# Altium schematic symbol library IC.SchLib: 555 symbols (part 3 of 15) (continued)
## HYB18TC1G160BF-3S (continued)

## ICS524
designator U?
1 to 4 Single-Ended Clock Buffer Low Skew; Manufacturer: IDT; Manufacturer No: 524MILF; Comment2: 2.5/5.0V 200MHz; Sort: 510; Tech: SMDR; Package: SOIC; Price: 0
footprint SOIC8-1
pins: 1 ICLK, 2 Q0, 3 Q1, 4 NC, 5 VDD (power), 6 Q2, 7 Q3, 8 GND (oe)

## ICS551
designator U?
1 to 4 Single-Ended Clock Buffer; Manufacturer: IDT; Manufacturer No: 551MILF; Comment2: 3.3/5.0V 160MHz; Sort: 510; Tech: SMDR; Package: SOIC; Price: 0
footprint SOIC8-1
pins: 1 ICLK, 2 Q1, 3 Q2, 4 Q3, 5 Q4, 6 GND, 7 VDD, 8 OE

## ICS841S01
designator U?
PCI EXPRES CLOCK GENERATOR; Manufacturer: IDT; Manufacturer No: ICS841S01BGLFT; Sort: 510; Tech: SMDR; Package: TSSOP16; Price: 0
signal-integrity model Model Name (Model Description)
footprint TSSOP16 (TSSOP16 5x4.4mm R0.65mm)
pins: 1 VSS_SRC (power), 2 VDD_SRC (power), 3 SRCT0 (out), 4 SRCC0 (out), 5 VDD_SRC (power), 6 VSS_SRC (power), 7 IREF (in), 8 VSSA (power), 9 VDDA (power), 10 VSS_REF (power), 11 VDD_REF (power), 12 XTAL_IN (in), 13 XTAL_OUT (in), 14 SCLK (in), 15 SDATA (io), 16 VDD_SRC (power)

## ICS853S011BGILFT
designator U?
2.5V / 3.3V LVPECL/ECL 1:2  Differential Fanout Buffer; Manufacturer: IDT; Comment2: 2.5GHz, 130ps skew 2.5&3.3Vcc; Sort: 510; Tech: SMDR; Manufacturer No: ICS853S011BGILFT; Package: TSSOP8; Price: 0
footprint TSSOP8 (TSSOP8 3x3mm R0.65mm)
signal-integrity model Model Name (Model Description)
pins: 1 Q0 (out), 2 ~{Q0} (out), 3 Q1 (out), 4 ~{Q1} (out), 5 VEE (power), 6 ~{D} (in), 7 D (in), 8 VCC (power)

## ICS83026I-01
designator U?
Low skew, 1-to2, Differential to LVCMOS/LVTTL fanout buffer; Manufacturer: IDT; Manufacturer No: ICS83026BMI-01LF; Sort: 510; Tech: SMDR; Package: SOIC8; Price: 0
footprint SOIC8-1
signal-integrity model Model Name (Model Description)
pins: 1 Vdd (power), 2 CLK (in), 3 ~{CLK} (in), 4 OE (in), 5 GND (power), 6 Q1 (out), 7 Q0 (out), 8 Vddo (power)

## ICS87021AMILF
designator U?
/1 /2 Differential to LVCMOS/LVTTL clock generator; Manufacturer: IDT; Comment2: 2V5 - 3V3; Sort: 510; Tech: SMDR; Manufacturer No: ICS87021AMILF; Package: SOIC8; Price: 0
footprint SOIC8-1
signal-integrity model Model Name (Model Description)
pins: 1 CLK (in), 2 ~{CLK} (in), 3 MR (in), 4 F_SEL (in), 5 GND (power), 6 Q1 (out), 7 Q0 (out), 8 Vdd (power)

## ICS853111BYLF
designator U?
low skew, 1 to 10, differential to 2.5V, 3.3V LVPECL/ECL fanout buffer; Manufacturer: IDT; Sort: 510; Tech: SMDR; Manufacturer No: ICS853111BYLF; Package: TQFP32; Price: 0
footprint TQFP80P900X900X120_HS-32N (TQFP, 32-Leads, Body 9,0x9,0mm (max), Pitch 0,80mm, IPC Medium Density)
pins: 1 VCC (power), 2 CLK_SEL (in), 3 PCLK0 (in), 4 ~{PCLK0} (in), 5 VBB (out), 6 PCLK1 (in), 7 ~{PCLK1} (in), 8 VEE (power), 9 VCCO (power), 10 ~{Q9} (out), 11 Q9 (out), 12 ~{Q8} (out), 13 Q8 (out), 14 ~{Q7} (out), 15 Q7 (out), 16 VCCO (power), 17 ~{Q6} (out), 18 Q6 (out), 19 ~{Q5} (out), 20 Q5 (out), 21 ~{Q4} (out), 22 Q4 (out), 23 ~{Q3} (out), 24 Q3 (out), 25 VCCO (power), 26 ~{Q2} (out), 27 Q2 (out), 28 ~{Q1} (out), 29 Q1 (out), 30 ~{Q0} (out), 31 Q0 (out), 32 VCCO (power), 33 GNDEP (power)

## IDL-25LC040A-I/P
designator U?
EEPROM 4kbit SPI 2.5-5.5V PDIP8; Manufacturer: Microchip; Comment2: 64Kbit 2.5-5.5V 10MHz SPI; Sort: 510; Tech: SMDR; Manufacturer No: 25LC040A-I/P; Package: PDIP8; Price: 0; Supplier 1: Mouser; Supplier Part Number 1: 579-25LC040A-I/P; Supplier 2: Newark; Supplier Part Number 2: 35M0835; Supplier 3: Digi-Key; Supplier Part Number 3: 25LC040A-I/P-ND
signal-integrity model Model Name (Model Description)
footprint PDIL8 (DIP; 8 Leads; Row Spacing 7.62 mm; Pitch 2.54 mm)
pins: 1 ~{CS} (in), 2 SO (out), 3 ~{WP} (in), 4 VSS (power), 5 SI (in), 6 SCK (in), 7 ~{HOLD} (in), 8 VCC (power)

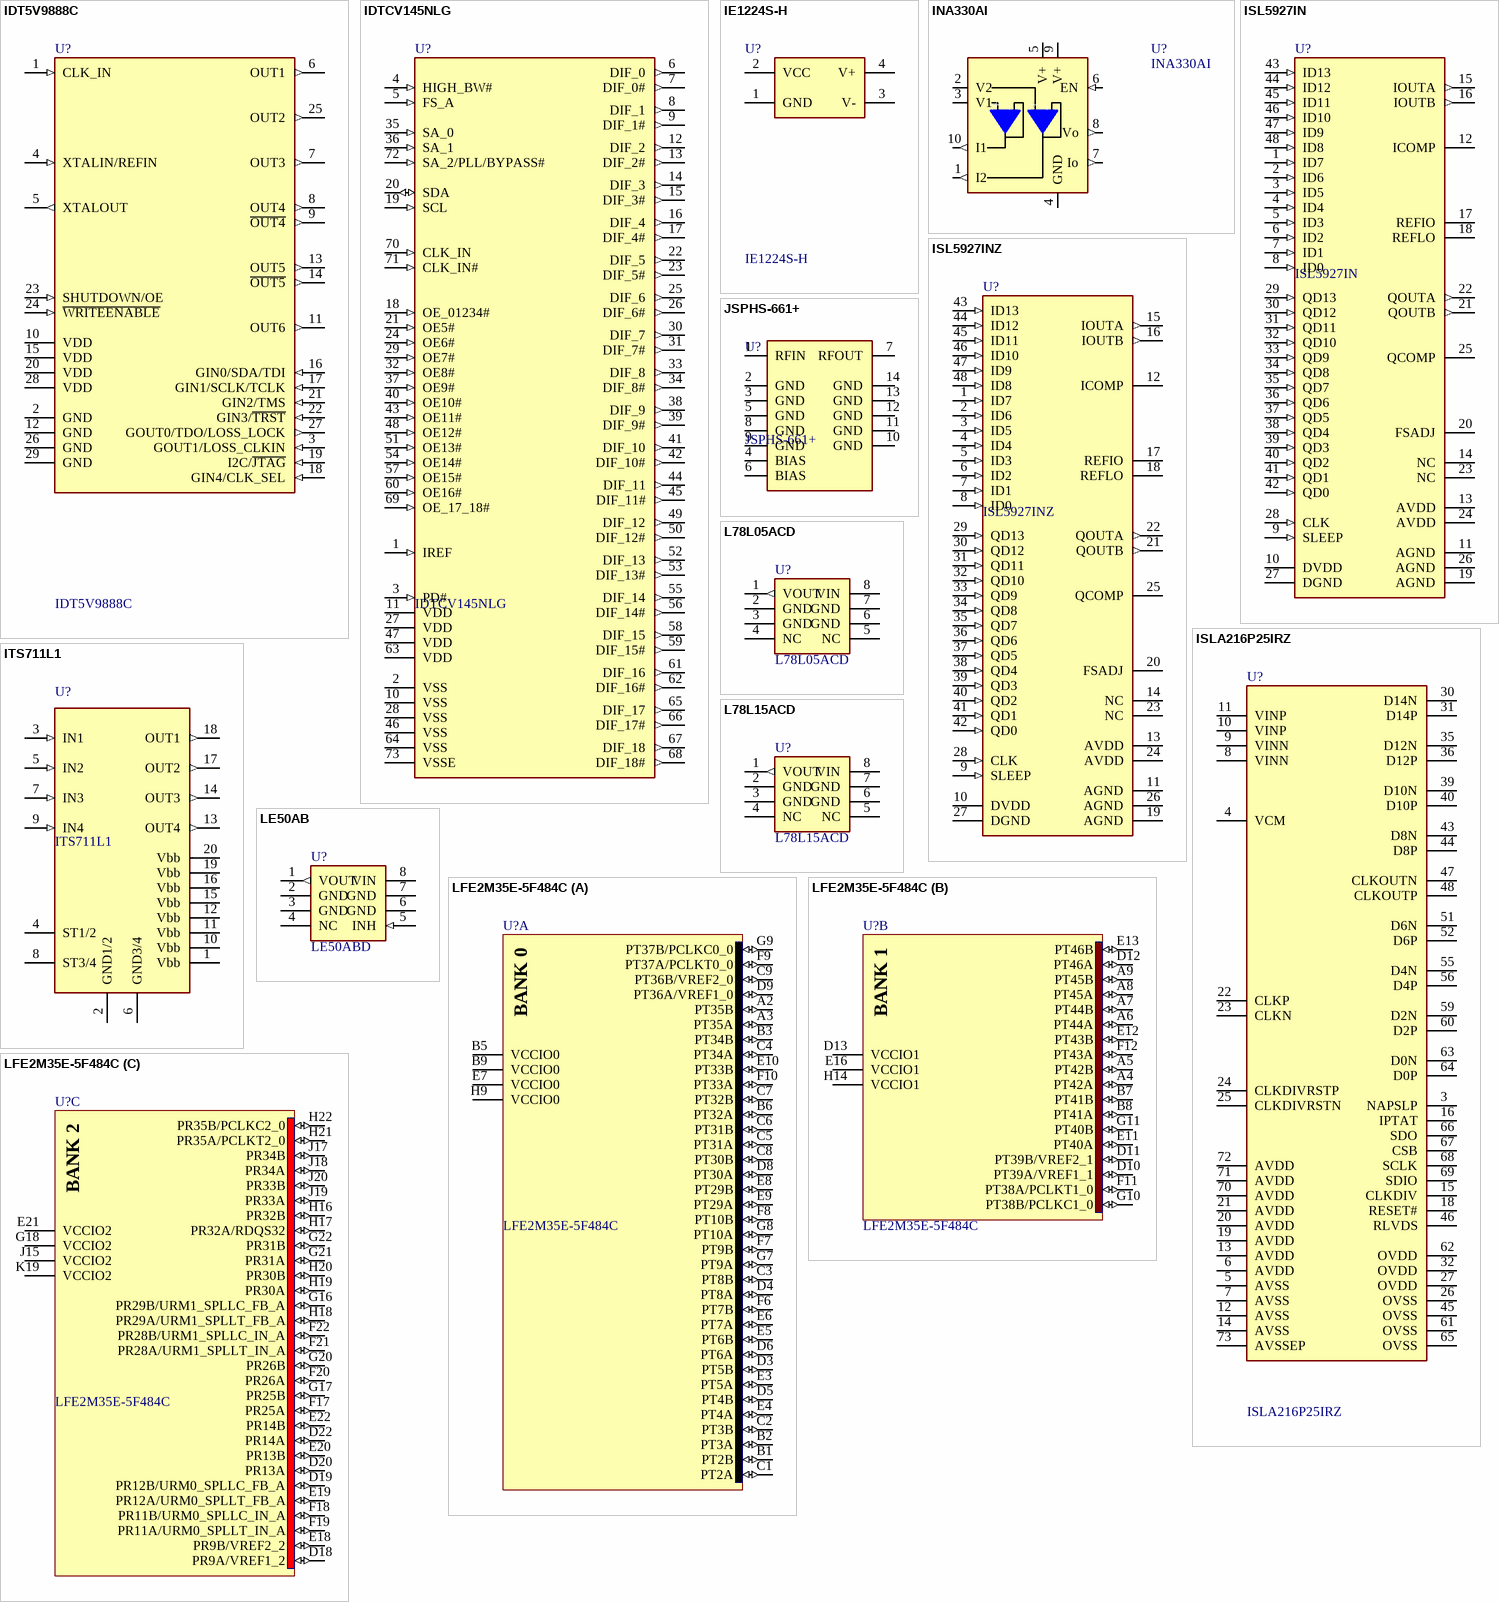
[diagram p12: symbols IDT5V9888C to LFE2M35E-5F484C]

## IDT5V9888C
designator U?
Programmable clock generator; Manufacturer No: IDT5V9888CNLGI; Manufacturer: IDT; Tech: SMDR; Sort: 510; Comment2: 3.3Vcc; Package: VFQFPN-28
footprint QFN65P600X600X100-28N (QFN, 28-Leads, Body 6,0x6,0mm (max), Pitch 0,65mm, IPC Medium Density)
pins: 1 CLK_IN (in), 2 GND (power), 3 GOUT1/LOSS_CLKIN (in), 4 XTALIN/REFIN (in), 5 XTALOUT (out), 6 OUT1 (out), 7 OUT3 (out), 8 OUT4 (out), 9 ~{OUT4} (out), 10 VDD (power), 11 OUT6 (out), 12 GND (power), 13 OUT5 (out), 14 ~{OUT5} (out), 15 VDD (power), 16 GIN0/SDA/TDI (in), 17 GIN1/SCLK/TCLK (in), 18 GIN4/CLK_SEL (in), 19 I2C/~{JTAG} (in), 20 VDD (power), 21 GIN2/TMS (in), 22 GIN3/~{TRST} (in), 23 SHUTDOWN/OE (in), 24 ~{WRITEENABLE} (in), 25 OUT2 (out), 26 GND (power), 27 GOUT0/TDO/LOSS_LOCK (out), 28 VDD (power), 29 GND (power)

## IDTCV145NLG
designator U?
1 - 19 differential clock buffer; Manufacturer: IDT; Tech: SMDR; Sort: 510; Comment2: 3.3Vcc; Manufacturer No: IDTCV145NLG; Package: VFQFPN-72
footprint TQFN72N
pins: 1 IREF (in), 2 VSS (power), 3 PD# (in), 4 HIGH_BW# (in), 5 FS_A (in), 6 DIF_0 (out), 7 DIF_0# (out), 8 DIF_1 (out), 9 DIF_1# (out), 10 VSS (power), 11 VDD (power), 12 DIF_2 (out), 13 DIF_2# (out), 14 DIF_3 (out), 15 DIF_3# (out), 16 DIF_4 (out), 17 DIF_4# (out), 18 OE_01234# (in), 19 SCL (in), 20 SDA (io), 21 OE5# (in), 22 DIF_5 (out), 23 DIF_5# (out), 24 OE6# (in), 25 DIF_6 (out), 26 DIF_6# (out), 27 VDD (power), 28 VSS (power), 29 OE7# (in), 30 DIF_7 (out), 31 DIF_7# (out), 32 OE8# (in), 33 DIF_8 (out), 34 DIF_8# (out), 35 SA_0 (in), 36 SA_1 (in), 37 OE9# (in), 38 DIF_9 (out), 39 DIF_9# (out), 40 OE10# (in), 41 DIF_10 (out), 42 DIF_10# (out), 43 OE11# (in), 44 DIF_11 (out), 45 DIF_11# (out), 46 VSS (power), 47 VDD (power), 48 OE12# (in), 49 DIF_12 (out), 50 DIF_12# (out), 51 OE13# (in), 52 DIF_13 (out), 53 DIF_13# (out), 54 OE14# (in), 55 DIF_14 (out), 56 DIF_14# (out), 57 OE15# (in), 58 DIF_15 (out), 59 DIF_15# (out), 60 OE16# (in), 61 DIF_16 (out), 62 DIF_16# (out), 63 VDD (power), 64 VSS (power), 65 DIF_17 (out), 66 DIF_17# (out), 67 DIF_18 (out), 68 DIF_18# (out), 69 OE_17_18# (in), 70 CLK_IN (in), 71 CLK_IN# (in), 72 SA_2/PLL/BYPASS# (in), 73 VSSE (power)

## IE1224S-H
designator U?
DC/DC converter, XP Power; Comment2: 1W, 12/24V; Sort: 550; Tech: SMDR; Manufacturer: XP Power; Manufacturer No: IE1224S-H; Package: SIP-4; Price: 0
footprint SIP-4 (SIP 4 pin, Body 11.68x6.0x9.65mm (LxWxH), Pitch 2,54mm)
footprint SIP-4L (SIP 4 pin, Body 11.68x6.0x9.65mm (LxWxH), Pitch 2,54mm)
pins: 1 GND (power), 2 VCC (power), 3 V- (power), 4 V+ (power)

## INA330AI
designator U?
Thermistor amplifier for temp. control; Manufacturer: Texas, Digikey; Manufacturer No: INA330AIDGST, 296-13861-1-ND; Comment2: 2.7..5.5Vcc (TLB); Sort: 520; Tech: SMDR; Package: MSOP10; Price: 6.6
footprint MSOP10-1 (MSOP 10pin 3x3mm R0.5mm)
pins: 1 I2 (out), 2 V2, 3 V1, 4 GND (power), 5 V+ (power), 6 EN (in), 7 Io (out), 8 Vo (out), 9 V+ (power), 10 I1 (out)
text: +; -

## ISL5927IN
designator U?
Dual 14bit 230 MSPS DAC Low Power; Manufacturer: Intersil; Tech: SMDR; Sort: 510; Manufacturer No: ISL5927IN; Package: LQFP48
footprint LQFP48 (LQFP, 48-Leads, Body 9,0x9,0mm (max), Pitch 0,50mm, IPC Medium Density)
pins: 1 ID7 (in), 2 ID6 (in), 3 ID5 (in), 4 ID4 (in), 5 ID3 (in), 6 ID2 (in), 7 ID1 (in), 8 ID0 (in), 9 SLEEP (in), 10 DVDD (power), 11 AGND (power), 12 ICOMP, 13 AVDD (power), 14 NC, 15 IOUTA (out), 16 IOUTB (out), 17 REFIO, 18 REFLO, 19 AGND (power), 20 FSADJ, 21 QOUTB (out), 22 QOUTA (out), 23 NC, 24 AVDD (power), 25 QCOMP, 26 AGND (power), 27 DGND (power), 28 CLK (in), 29 QD13 (in), 30 QD12 (in), 31 QD11 (in), 32 QD10 (in), 33 QD9 (in), 34 QD8 (in), 35 QD7 (in), 36 QD6 (in), 37 QD5 (in), 38 QD4 (in), 39 QD3 (in), 40 QD2 (in), 41 QD1 (in), 42 QD0 (in), 43 ID13 (in), 44 ID12 (in), 45 ID11 (in), 46 ID10 (in), 47 ID9 (in), 48 ID8 (in)

## ISL5927INZ
designator U?
Dual 14bit 260 MSPS DAC Low Power; Manufacturer No: ISL5927INZ, ISL5927INZ-ND; Manufacturer: Intersil, Digikey; Tech: SMDR; Sort: 510; Package: LQFP48
footprint TSQFP50P900X900X160-48N-B (TSQFP, 48-Leads, Body 9,0x9,0mm (max), Pitch 0,50mm, IPC Medium Density)
pins: 1 ID7 (in), 2 ID6 (in), 3 ID5 (in), 4 ID4 (in), 5 ID3 (in), 6 ID2 (in), 7 ID1 (in), 8 ID0 (in), 9 SLEEP (in), 10 DVDD (power), 11 AGND (power), 12 ICOMP, 13 AVDD (power), 14 NC, 15 IOUTA (out), 16 IOUTB (out), 17 REFIO, 18 REFLO, 19 AGND (power), 20 FSADJ, 21 QOUTB (out), 22 QOUTA (out), 23 NC, 24 AVDD (power), 25 QCOMP, 26 AGND (power), 27 DGND (power), 28 CLK (in), 29 QD13 (in), 30 QD12 (in), 31 QD11 (in), 32 QD10 (in), 33 QD9 (in), 34 QD8 (in), 35 QD7 (in), 36 QD6 (in), 37 QD5 (in), 38 QD4 (in), 39 QD3 (in), 40 QD2 (in), 41 QD1 (in), 42 QD0 (in), 43 ID13 (in), 44 ID12 (in), 45 ID11 (in), 46 ID10 (in), 47 ID9 (in), 48 ID8 (in)

## ISLA216P25IRZ
designator U?
Dual 14bit 105MHz ADC Low power 3V; Manufacturer: Intersil; Sort: 510; Tech: SMDR; Manufacturer No: ISLA216P25IRZ; Package: QFN72; Price: 0
footprint QFN50P1000X1000X85-72N_EPSHIFT (QFN, 72-Leads, Body 10,0x10,0mm (max), Pitch 0,50mm, IPC Medium Density)
signal-integrity model Model Name (Model Description)
pins: 3 NAPSLP, 4 VCM, 5 AVSS, 6 AVDD, 7 AVSS, 8 VINN, 9 VINN, 10 VINP, 11 VINP, 12 AVSS, 13 AVDD, 14 AVSS, 15 CLKDIV, 16 IPTAT, 18 RESET#, 19 AVDD, 20 AVDD, 21 AVDD, 22 CLKP, 23 CLKN, 24 CLKDIVRSTP, 25 CLKDIVRSTN, 26 OVSS, 27 OVDD, 30 D14N, 31 D14P, 32 OVDD, 35 D12N, 36 D12P, 39 D10N, 40 D10P, 43 D8N, 44 D8P, 45 OVSS, 46 RLVDS, 47 CLKOUTN, 48 CLKOUTP, 51 D6N, 52 D6P, 55 D4N, 56 D4P, 59 D2N, 60 D2P, 61 OVSS, 62 OVDD, 63 D0N, 64 D0P, 65 OVSS, 66 SDO, 67 CSB, 68 SCLK, 69 SDIO, 70 AVDD, 71 AVDD, 72 AVDD, 73 AVSSEP

## ITS711L1
designator U?
High Side 4ch protected Switch; Manufacturer: Infineon; Comment2: 1.9A, 5-34V; Sort: 510; Tech: SMDR; Manufacturer No: ITS711L1; Package: SOIC20; Price: 4.8
footprint SOIC20N (SOIC20, Body 12,9x7,6mm, R1,27mm, IPC Medium Density)
pins: 1 Vbb (power), 2 GND1/2 (power), 3 IN1 (in), 4 ST1/2 (oc), 5 IN2 (in), 6 GND3/4 (power), 7 IN3 (in), 8 ST3/4 (oc), 9 IN4 (in), 10 Vbb (power), 11 Vbb (power), 12 Vbb (power), 13 OUT4 (out), 14 OUT3 (out), 15 Vbb (power), 16 Vbb (power), 17 OUT2 (out), 18 OUT1 (out), 19 Vbb (power), 20 Vbb (power)

## JSPHS-661+
designator U?
Phase shifter 400-660MHz; Manufacturer: MiniCircuits; Comment2: 400-660MHz, 0~12Vctrl, 0~180°; Sort: 510; Tech: SMDR; Manufacturer No: JSPHS-661+; Package: HF-BK276; Price: 0
footprint HF-BK276 (BK276 Minicircuits RF package)
pins: 1 RFIN, 2 GND, 3 GND, 4 BIAS, 5 GND, 6 BIAS, 7 RFOUT, 8 GND, 9 GND, 10 GND, 11 GND, 12 GND, 13 GND, 14 GND
1 alternate drawing of the same symbol

## L78L05ACD
designator U?
Voltage regulator 5V 0.1A SOIC8; Manufacturer: STMicroelectronics; Sort: 510; Tech: SMDR; Manufacturer No: L78L05ACD; Package: SOIC8; Price: 0
footprint SOIC8-1
pins: 1 VOUT (out), 2 GND (power), 3 GND (power), 4 NC, 5 NC, 6 GND (power), 7 GND (power), 8 VIN (power)

## L78L15ACD
designator U?
Voltage regulator 15V 0.1A SOIC8; Manufacturer: STMicroelectronics; Sort: 510; Tech: SMDR; Manufacturer No: L78L15ACD; Package: SOIC8; Price: 0
footprint SOIC8-1
pins: 1 VOUT (out), 2 GND (power), 3 GND (power), 4 NC, 5 NC, 6 GND (power), 7 GND (power), 8 VIN (power)

## LE50AB
designator U?, comment LE50ABD
Low drop regulator 5.0V 0.1A SOIC8; Manufacturer: ST Microelectronics; Sort: 510; Tech: SMDR; Manufacturer No: LE50ABD; Package: SOIC8; Price: 0
footprint SOIC8-1
pins: 1 VOUT (out), 2 GND (power), 3 GND (power), 4 NC, 5 INH (in), 6 GND (power), 7 GND (power), 8 VIN (power)

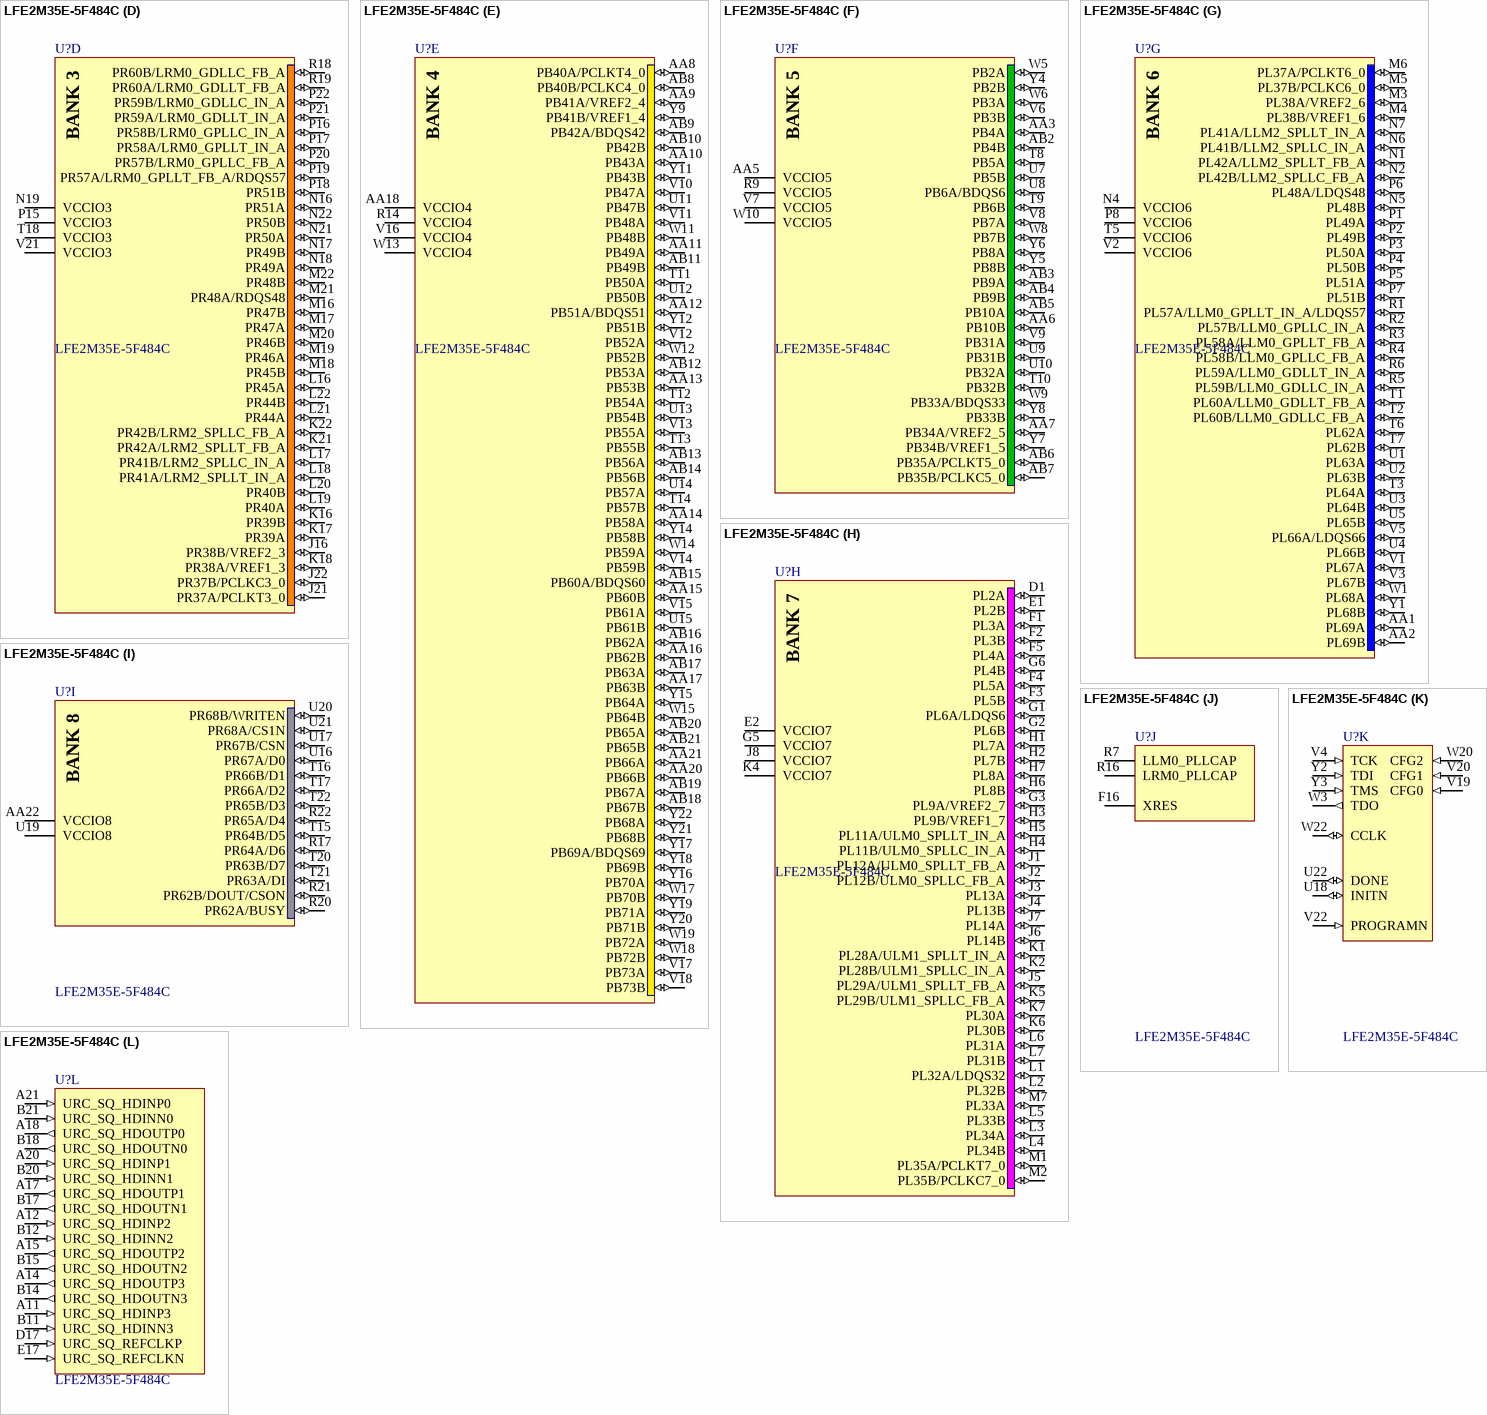
[diagram p13: symbol LFE2M35E-5F484C]

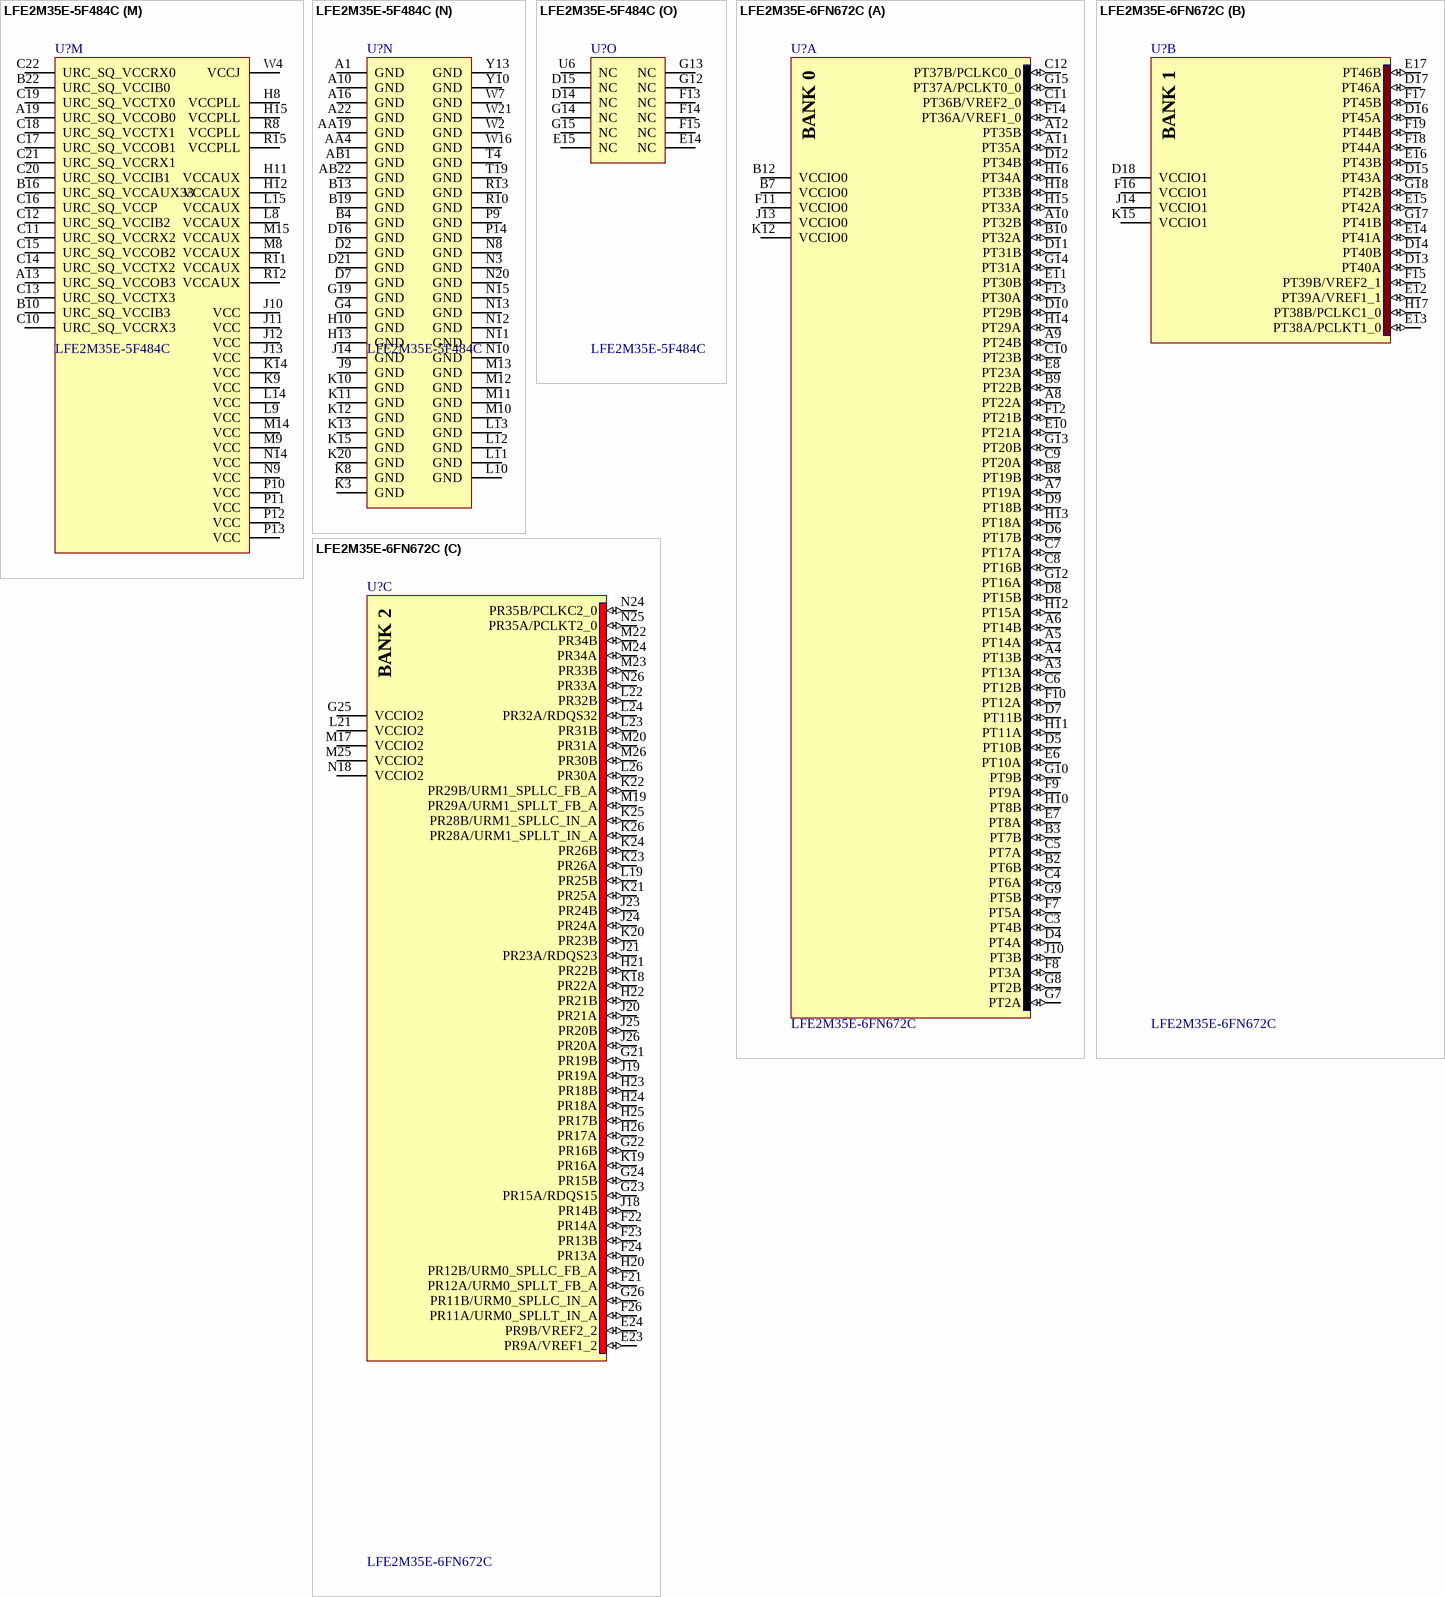
[diagram p14: symbols LFE2M35E-5F484C to LFE2M35E-6FN672C]